# Altium footprint library connectors_socets.pcblib: 601 footprints (part 5 of 38)
Each footprint in its own frame and in the unit in brackets; x right, y up, seen from the top. Pads: shape width x height; smd on the part's side, far side on the other; paste and mask are expansions set on the pad; w line width, h text height; cw(c..) or ccw(c..) is an arc to the next point about the centre after c.
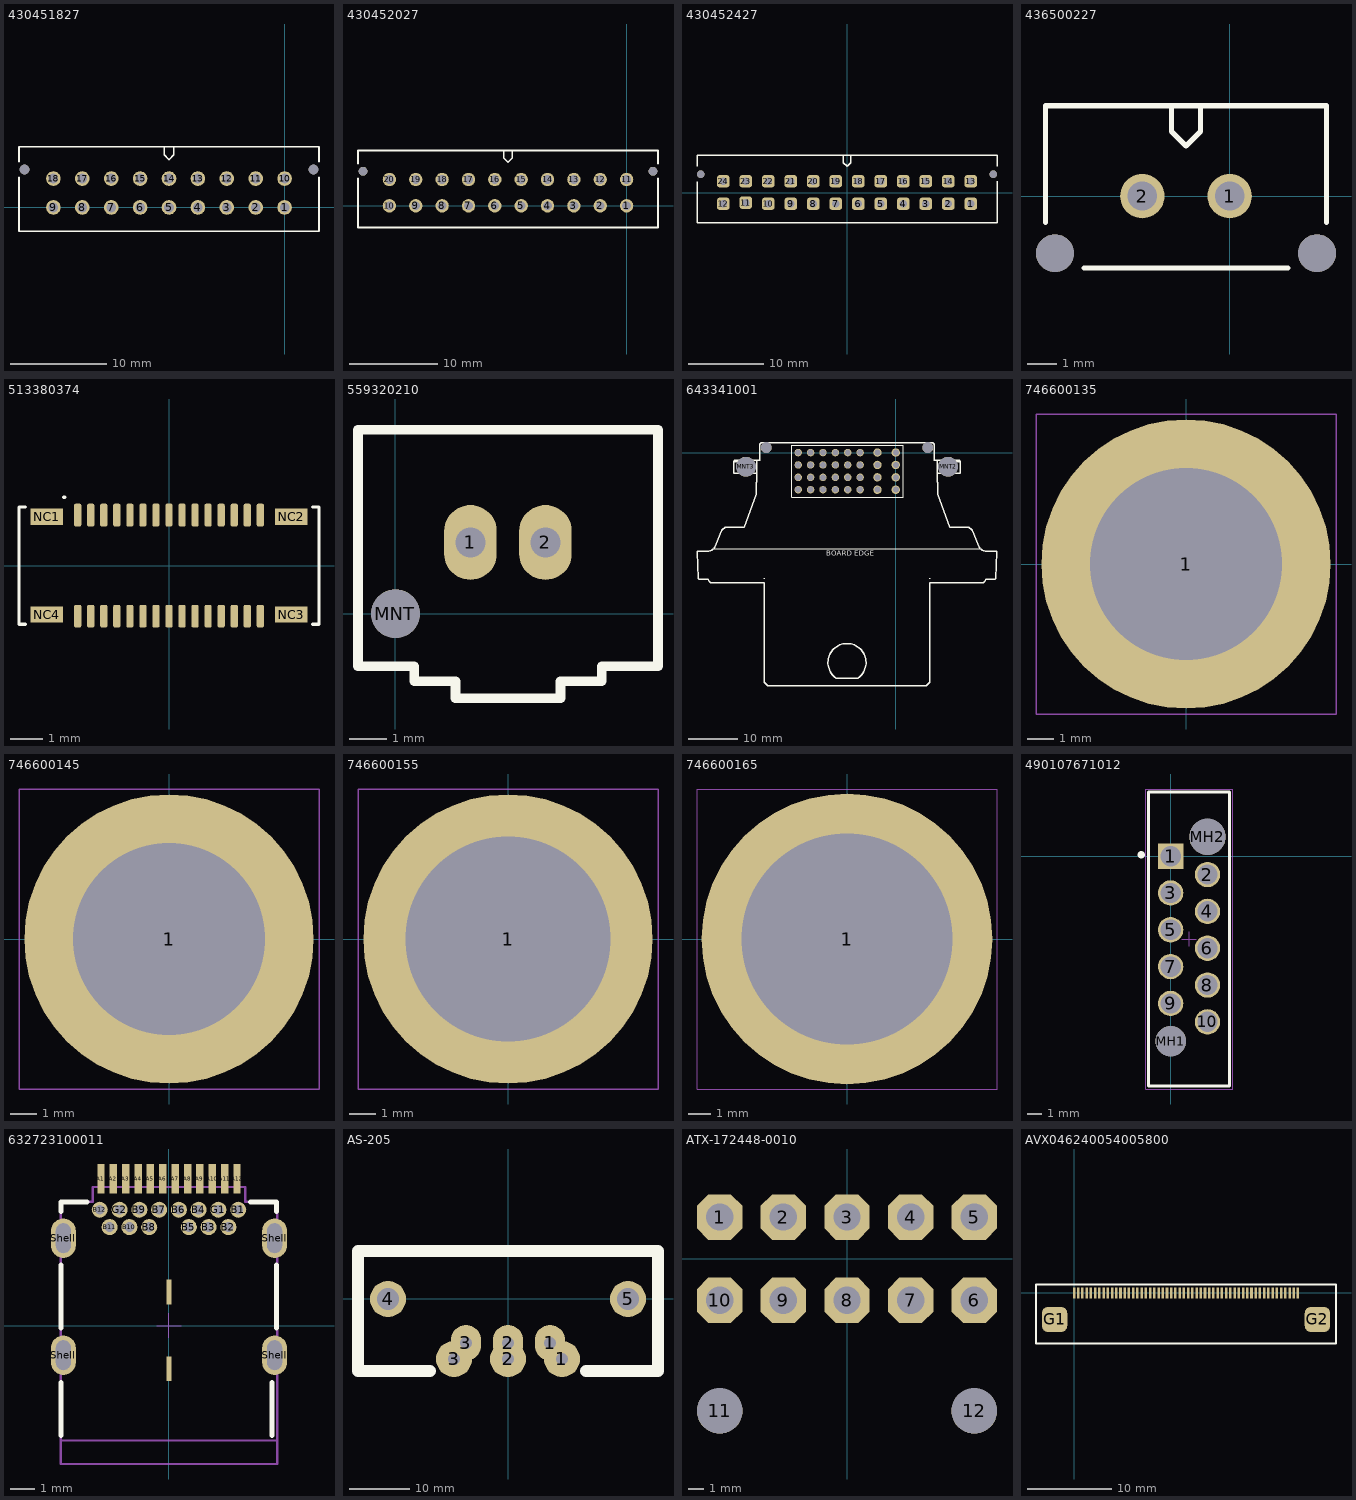
[diagram p4: the footprints below, top view; thin cyan lines are the x and y axes]

## 430451827 [mm]
height 9.91
pads (20):
  round 1.52 hole 1 mask+0.076: 1(0,0) 2(-3,0) 3(-6,0) 4(-9,0) 5(-12,0) 6(-15,0) 7(-18,0) 8(-21,0) 9(-24,0) 10(0,3) 11(-3,3) 12(-6,3) 13(-9,3) 14(-12,3) 15(-15,3) 16(-18,3) 17(-21,3) 18(-24,3)
  round 1 hole 1 unplated: MNT1(-27,3.94) MNT1(3,3.94)
Top Overlay:
  lines w0.18: -27.575,3.11 -27.575,-2.47 3.575,-2.47 3.575,3.11 ; -27.575,4.77 -27.575,6.3 3.575,6.3 3.575,4.77 ; -12.5,6.3 -12.5,5.47 -12,4.97 -11.5,5.47 -11.5,6.3
3D body "430451827--3DModel-STEP-56544.STEP": height 9.91, standoff -3.18, extent -27.575,-2.47 3.575,6.3

## 430452027 [mm]
height 9.91
pads (22):
  round 1.52 hole 1 mask+0.076: 1(0,0) 2(-3,0) 3(-6,0) 4(-9,0) 5(-12,0) 6(-15,0) 7(-18,0) 8(-21,0) 9(-24,0) 10(-27,0) 11(0,3) 12(-3,3) 13(-6,3) 14(-9,3) 15(-12,3) 16(-15,3) 17(-18,3) 18(-21,3) 19(-24,3) 20(-27,3)
  round 1 hole 1 unplated: MNT1(-30,3.94) MNT1(3,3.94)
Top Overlay:
  lines w0.18: -30.575,3.11 -30.575,-2.47 3.575,-2.47 3.575,3.11 ; -30.575,4.77 -30.575,6.3 3.575,6.3 3.575,4.77 ; -14,6.3 -14,5.47 -13.5,4.97 -13,5.47 -13,6.3
3D body "430452027--3DModel-STEP-56544.STEP": height 9.91, standoff -3.18, extent -30.575,-2.47 3.575,6.3

## 430452427 [mm]
pads (26):
  rrect50% 1.7x1.7 hole 1: 1(16.5,-1.47) 2(13.5,-1.47) 3(10.5,-1.47) 4(7.5,-1.47) 5(4.5,-1.47) 6(1.5,-1.47) 7(-1.5,-1.47) 8(-4.5,-1.47) 9(-7.5,-1.47) 10(-10.5,-1.47) 11(-13.5,-1.326) 12(-16.5,-1.47) 13(16.5,1.53) 14(13.5,1.53) 15(10.5,1.53) 16(7.5,1.53) 17(4.5,1.53) 18(1.5,1.53) 19(-1.5,1.53) 20(-4.5,1.53) 21(-7.5,1.53) 22(-10.5,1.53) 23(-13.5,1.53) 24(-16.5,1.53)
  round 1 hole 1 unplated: MNT1(19.5,2.47) MNT2(-19.5,2.47)
Top Overlay:
  lines w0.18: -20,1.5 -20,-4 20,-4 20,1.53 ; -20,3.5 -20,5 20,5 20,3.5 ; -0.5,5 -0.5,4 0,3.5 0.5,4 0.5,5
3D body "430452427.stp": height 9.95, standoff -3.14, extent -20.075,-3.94 20.075,4.83

## 436500227 [mm]
height 9.9
pads (4):
  round 1.52 hole 1 mask+0.076: 1(0,0) 2(-3,0)
  round 1.3 hole 1.3 unplated mask+0.076: ""(-6,-1.96) ""(3,-1.96)
Top Overlay:
  lines w0.18: -6.325,-0.9 -6.325,3.1 3.325,3.1 3.325,-0.9 ; -5,-2.47 2,-2.47 ; -2,3.05 -2,2.22 -1.5,1.72 -1,2.22 -1,3.05
Plata3D:
3D body "436500227--3DModel-STEP-455599.STEP": height 9.9, standoff -3.18, extent -6.325,-2.47 3.325,3.135

## 513380374 [mm] "molex board to board"
pads (34):
  rrect50% 0.22x0.7 smd mask+0.05: 1(-2.8,1.55) 2(-2.4,1.55) 3(-2,1.55) 4(-1.6,1.55) 5(-1.2,1.55) 6(-0.8,1.55) 7(-0.4,1.55) 8(0,1.55) 9(0.4,1.55) 10(0.8,1.55) 11(1.2,1.55) 12(1.6,1.55) 13(2,1.55) 14(2.4,1.55) 15(2.8,1.55) 16(2.8,-1.55) 17(2.4,-1.55) 18(2,-1.55) 19(1.6,-1.55) 20(1.2,-1.55) 21(0.8,-1.55) 22(0.4,-1.55) 23(0,-1.55) 24(-0.4,-1.55) 25(-0.8,-1.55) 26(-1.2,-1.55) 27(-1.6,-1.55) 28(-2,-1.55) 29(-2.4,-1.55) 30(-2.8,-1.55)
  rect 1x0.5 smd mask+0.05: NC1(-3.75,1.5) NC2(3.75,1.5) NC3(3.75,-1.5) NC4(-3.75,-1.5)
Top Overlay:
  lines w0.1: -4.4,-1.8 -4.6,-1.8 -4.6,1.8 -4.4,1.8 ; -3.225,2.1 -3.2,2.1 ; 4.4,-1.8 4.6,-1.8 4.6,1.8 4.4,1.8
3D body "513380374.stp": height 1.4, standoff 0, extent -4.55,-1.705 4.55,1.705

## 559320210 [mm] "2pin molex pcb"
pads (3):
  oval 1.4x2 hole 0.8: 1(2,1.9) 2(4,1.9)
  round 1.3 hole 1.3 unplated: MNT(0,0)
Top Overlay:
  lines w0.254: -1,-1.4 -1,0.3 -1,3.7 -1,4.9 0.75,4.9 5.25,4.9 7,4.9 7,3.7 7,0.3 7,-1.4 5.5,-1.4 5.5,-1.8 4.4,-1.8 4.4,-2.25 4,-2.25 2,-2.25 1.6,-2.25 1.6,-1.8 0.5,-1.8 0.5,-1.4 -1,-1.4
3D body "559320210.stp": height 9.75, standoff -3.19, extent -1,-1.8 7,4.9

## 643341001 [mm] "Molex connectors"
pads (36):
  round 1.5 hole 1.2: A1(-19.7,0) A2(-19.7,-2.5) A3(-19.7,-4.999) A4(-19.7,-7.499) B1(-17.2,0) B2(-17.2,-2.5) B3(-17.2,-4.999) B4(-17.2,-7.499) C1(-14.7,0) C2(-14.7,-2.5) C3(-14.7,-4.999) C4(-14.7,-7.499) D1(-12.2,0) D2(-12.2,-2.5) D3(-12.2,-4.999) D4(-12.2,-7.499) E1(-9.7,0) E2(-9.7,-2.5) E3(-9.7,-4.999) E4(-9.7,-7.499) F1(-7.2,0) F2(-7.2,-2.5) F3(-7.2,-4.999) F4(-7.2,-7.499)
  round 1.7 hole 1.2: G1(-3.7,0) G2(-3.7,-2.5) G3(-3.7,-4.999) G4(-3.7,-7.499) H1(0,0) H2(0,-2.5) H3(0,-4.999) H4(0,-7.499)
  round 2.2 hole 2.2 unplated: MNT1(6.45,1) MNT4(-26.15,1)
  round 4 hole 4 unplated: MNT2(10.55,-2.85) MNT3(-30.25,-2.85)
Top Overlay:
  drawing of 589 lines, arcs and shapes, not listed
  text "BOARD EDGE" at -14,-20.85 h1
3D body "643341001.stp": height 32.16, standoff -8.02, extent -40.138,-47.1 20.438,2

## 746600135 [mm] "Bush SMD open"
height 3
pads (1):
  round 11 / inner round 0 / far side round 0 hole 7.3 unplated: 1(0,0)
Top Paste:
  region: 0.5,5.377 0.811,5.348 1.421,5.219 2.013,5.02 2.578,4.755 3.109,4.427 3.598,4.039 4.039,3.598 4.427,3.109 4.755,2.578 5.02,2.013 5.219,1.421 5.348,0.811 5.377,0.5 3.716,0.5 3.663,0.801 3.485,1.384 3.214,1.931 2.859,2.427 2.427,2.859 1.931,3.214 1.385,3.485 0.801,3.663 0.5,3.716
  region: 5.377,-0.5 5.348,-0.811 5.219,-1.421 5.02,-2.013 4.755,-2.578 4.427,-3.109 4.039,-3.598 3.598,-4.039 3.109,-4.427 2.578,-4.755 2.013,-5.02 1.421,-5.219 0.811,-5.348 0.5,-5.377 0.5,-3.716 0.801,-3.663 1.384,-3.485 1.931,-3.214 2.427,-2.859 2.859,-2.427 3.214,-1.931 3.485,-1.385 3.663,-0.801 3.716,-0.5
  region: -0.5,-5.377 -0.811,-5.348 -1.421,-5.219 -2.013,-5.02 -2.578,-4.755 -3.109,-4.427 -3.598,-4.039 -4.039,-3.598 -4.427,-3.109 -4.755,-2.578 -5.02,-2.013 -5.219,-1.421 -5.348,-0.811 -5.377,-0.5 -3.716,-0.5 -3.663,-0.801 -3.485,-1.384 -3.214,-1.931 -2.859,-2.427 -2.427,-2.859 -1.931,-3.214 -1.385,-3.485 -0.801,-3.663 -0.5,-3.716
  region: -5.377,0.5 -5.348,0.811 -5.219,1.421 -5.02,2.013 -4.755,2.578 -4.427,3.109 -4.039,3.598 -3.598,4.039 -3.109,4.427 -2.578,4.755 -2.013,5.02 -1.421,5.219 -0.811,5.348 -0.5,5.377 -0.5,3.716 -0.801,3.663 -1.384,3.485 -1.931,3.214 -2.427,2.859 -2.859,2.427 -3.214,1.931 -3.485,1.385 -3.663,0.801 -3.716,0.5
Plata3D:
  circle w0.1: c0,0 r5
Board3D:
  lines w0.05: -0.5,0 0.5,0 ; 0,-0.5 0,0.5 ; -5.7,-5.7 5.7,-5.7 5.7,5.7 -5.7,5.7 -5.7,-5.7
3D body "746600135.stp": height 3, standoff -2.6, extent -5,-5 5,5

## 746600145 [mm] "Bush SMD open"
height 3
pads (1):
  round 11 / inner round 0 / far side round 0 hole 7.3 unplated: 1(0,0)
Top Paste:
  region: 0.5,5.377 0.811,5.348 1.421,5.219 2.013,5.02 2.578,4.755 3.109,4.427 3.598,4.039 4.039,3.598 4.427,3.109 4.755,2.578 5.02,2.013 5.219,1.421 5.348,0.811 5.377,0.5 3.717,0.5 3.664,0.801 3.485,1.384 3.214,1.931 2.859,2.427 2.427,2.859 1.931,3.214 1.384,3.485 0.801,3.664 0.5,3.717
  region: -5.377,0.5 -5.348,0.811 -5.219,1.421 -5.02,2.013 -4.755,2.578 -4.427,3.109 -4.039,3.598 -3.598,4.039 -3.109,4.427 -2.578,4.755 -2.013,5.02 -1.421,5.219 -0.811,5.348 -0.5,5.377 -0.5,3.717 -0.801,3.664 -1.384,3.485 -1.931,3.214 -2.427,2.859 -2.859,2.427 -3.214,1.931 -3.485,1.384 -3.664,0.801 -3.717,0.5
  region: -0.5,-5.377 -0.811,-5.348 -1.421,-5.219 -2.013,-5.02 -2.578,-4.755 -3.109,-4.427 -3.598,-4.039 -4.039,-3.598 -4.427,-3.109 -4.755,-2.578 -5.02,-2.013 -5.219,-1.421 -5.348,-0.811 -5.377,-0.5 -3.717,-0.5 -3.664,-0.801 -3.485,-1.384 -3.214,-1.931 -2.859,-2.427 -2.427,-2.859 -1.931,-3.214 -1.384,-3.485 -0.801,-3.664 -0.5,-3.717
  region: 5.377,-0.5 5.348,-0.811 5.219,-1.421 5.02,-2.013 4.755,-2.578 4.427,-3.109 4.039,-3.598 3.598,-4.039 3.109,-4.427 2.578,-4.755 2.013,-5.02 1.421,-5.219 0.811,-5.348 0.5,-5.377 0.5,-3.717 0.801,-3.664 1.384,-3.485 1.931,-3.214 2.427,-2.859 2.859,-2.427 3.214,-1.931 3.485,-1.384 3.664,-0.801 3.717,-0.5
Plata3D:
  circle w0.1: c0,0 r5
Board3D:
  lines w0.05: -0.5,0 0.5,0 ; 0,-0.5 0,0.5 ; -5.7,-5.7 5.7,-5.7 5.7,5.7 -5.7,5.7 -5.7,-5.7
3D body "746600145.stp": height 3, standoff -2.6, extent -5,-5 5,5

## 746600155 [mm] "Bush SMD open"
height 3
pads (1):
  round 11 / inner round 0 / far side round 0 hole 7.8 unplated: 1(0,0)
Top Paste:
  region: 3.969,-0.5 3.935,-0.717 3.833,-1.145 3.684,-1.559 3.49,-1.954 3.255,-2.325 2.98,-2.669 2.669,-2.98 2.325,-3.255 1.954,-3.49 1.559,-3.684 1.145,-3.833 0.717,-3.935 0.5,-3.969 0.5,-5.377 0.811,-5.348 1.421,-5.219 2.013,-5.02 2.578,-4.755 3.109,-4.427 3.598,-4.039 4.039,-3.598 4.427,-3.109 4.755,-2.578 5.02,-2.013 5.219,-1.421 5.348,-0.811 5.377,-0.5
  region: -0.5,-3.969 -0.717,-3.935 -1.145,-3.833 -1.559,-3.684 -1.954,-3.49 -2.325,-3.255 -2.669,-2.98 -2.98,-2.669 -3.255,-2.325 -3.49,-1.954 -3.684,-1.559 -3.833,-1.145 -3.935,-0.717 -3.969,-0.5 -5.377,-0.5 -5.348,-0.811 -5.219,-1.421 -5.02,-2.013 -4.755,-2.578 -4.427,-3.109 -4.039,-3.598 -3.598,-4.039 -3.109,-4.427 -2.578,-4.755 -2.013,-5.02 -1.421,-5.219 -0.811,-5.348 -0.5,-5.377
  region: -3.969,0.5 -3.935,0.717 -3.833,1.145 -3.684,1.559 -3.49,1.954 -3.255,2.325 -2.98,2.669 -2.669,2.98 -2.325,3.255 -1.954,3.49 -1.559,3.684 -1.145,3.833 -0.717,3.935 -0.5,3.969 -0.5,5.377 -0.811,5.348 -1.421,5.219 -2.013,5.02 -2.578,4.755 -3.109,4.427 -3.598,4.039 -4.039,3.598 -4.427,3.109 -4.755,2.578 -5.02,2.013 -5.219,1.421 -5.348,0.811 -5.377,0.5
  region: 0.5,3.969 0.717,3.935 1.145,3.833 1.559,3.684 1.954,3.49 2.325,3.255 2.669,2.98 2.98,2.669 3.255,2.325 3.49,1.954 3.684,1.559 3.833,1.145 3.935,0.717 3.969,0.5 5.377,0.5 5.348,0.811 5.219,1.421 5.02,2.013 4.755,2.578 4.427,3.109 4.039,3.598 3.598,4.039 3.109,4.427 2.578,4.755 2.013,5.02 1.421,5.219 0.811,5.348 0.5,5.377
Plata3D:
  circle w0.1: c0,0 r5
Board3D:
  lines w0.05: -0.5,0 0.5,0 ; 0,-0.5 0,0.5 ; -5.7,-5.7 5.7,-5.7 5.7,5.7 -5.7,5.7 -5.7,-5.7
3D body "746600155.stp": height 3, standoff -2.6, extent -5,-5 5,5

## 746600165 [mm] "Bush SMD open"
height 3
pads (1):
  round 12.8 / inner round 0 / far side round 0 hole 9.3 unplated: 1(0,0)
Top Paste:
  region: 0.5,6.28 0.5,4.724 0.767,4.688 1.292,4.571 1.8,4.396 2.286,4.164 2.742,3.879 3.163,3.544 3.544,3.163 3.879,2.742 4.164,2.286 4.396,1.8 4.571,1.292 4.688,0.767 4.724,0.5 6.28,0.5 6.251,0.87 6.105,1.598 5.876,2.303 5.565,2.977 5.177,3.61 4.717,4.192 4.192,4.717 3.61,5.177 2.977,5.565 2.303,5.876 1.598,6.105 0.87,6.251
  region: 6.28,-0.5 4.724,-0.5 4.688,-0.767 4.571,-1.292 4.396,-1.8 4.164,-2.286 3.879,-2.742 3.544,-3.163 3.163,-3.544 2.742,-3.879 2.286,-4.164 1.8,-4.396 1.292,-4.571 0.767,-4.688 0.5,-4.724 0.5,-6.28 0.87,-6.251 1.598,-6.105 2.303,-5.876 2.977,-5.565 3.61,-5.177 4.192,-4.717 4.717,-4.192 5.177,-3.61 5.565,-2.977 5.876,-2.303 6.105,-1.598 6.251,-0.87
  region: -0.5,-6.28 -0.5,-4.724 -0.767,-4.688 -1.292,-4.571 -1.8,-4.396 -2.286,-4.164 -2.742,-3.879 -3.163,-3.544 -3.544,-3.163 -3.879,-2.742 -4.164,-2.286 -4.396,-1.8 -4.571,-1.292 -4.688,-0.767 -4.724,-0.5 -6.28,-0.5 -6.251,-0.87 -6.105,-1.598 -5.876,-2.303 -5.565,-2.977 -5.177,-3.61 -4.717,-4.192 -4.192,-4.717 -3.61,-5.177 -2.977,-5.565 -2.303,-5.876 -1.598,-6.105 -0.87,-6.251
  region: -6.28,0.5 -4.724,0.5 -4.688,0.767 -4.571,1.292 -4.396,1.8 -4.164,2.286 -3.879,2.742 -3.544,3.163 -3.163,3.544 -2.742,3.879 -2.286,4.164 -1.8,4.396 -1.292,4.571 -0.767,4.688 -0.5,4.724 -0.5,6.28 -0.87,6.251 -1.598,6.105 -2.303,5.876 -2.977,5.565 -3.61,5.177 -4.192,4.717 -4.717,4.192 -5.177,3.61 -5.565,2.977 -5.876,2.303 -6.105,1.598 -6.251,0.87
Plata3D:
  circle w0.1: c0,0 r6
Board3D:
  lines w0.05: -0.5,0 0.5,0 ; 0,-0.5 0,0.5 ; -6.6,-6.6 6.6,-6.6 6.6,6.6 -6.6,6.6 -6.6,-6.6
3D body "746600165.stp": height 3, standoff -2.6, extent -6,-6 6,6

## 490107671012 [mm]
pads (12):
  rect 1.75x1.75 hole 1.4: 1(0,0)
  round 1.75 hole 1.4: 2(2.54,-1.27) 3(0,-2.54) 4(2.54,-3.81) 5(0,-5.08) 6(2.54,-6.35) 7(0,-7.62) 8(2.54,-8.89) 9(0,-10.16) 10(2.54,-11.43)
  round 2.1 hole 2.1 unplated: MH1(0,-12.76)
  round 2.5 hole 2.5 unplated: MH2(2.54,1.33)
Top Overlay:
  circle w0.25: c-2.03,0.095 r0.125
  lines w0.2: -1.53,-15.86 4.07,-15.86 4.07,4.43 -1.53,4.43 -1.53,-15.86
Plata3D:
  lines w0.1: -1.53,-15.86 -1.53,4.43 4.07,4.43 4.07,-15.86 -1.53,-15.86
Board3D:
  lines w0.05: 0.77,-5.715 1.77,-5.715 ; 1.27,-6.215 1.27,-5.215 ; -1.73,-16.06 -1.73,4.63 4.27,4.63 4.27,-16.06 -1.73,-16.06
3D body "490107671012.stp": height 10.5, standoff -4.45, extent -1.53,-15.86 4.07,4.43

## 632723100011 [mm] "USB 3.1 Type C Receptacle Horizontal THR"
height 2.96
pads (32):
  rect 0.3x1.2 smd: A1(-2.75,5.93) A2(-2.25,5.93) A3(-1.75,5.93) A4(-1.25,5.93) A5(-0.75,5.93) A6(-0.25,5.93) A7(0.25,5.93) A8(0.75,5.93) A9(1.25,5.93) A10(1.75,5.93) A11(2.25,5.93) A12(2.75,5.93)
  round 0.65 hole 0.4: B1(2.8,4.68) B2(2.4,3.98) B3(1.6,3.98) B4(1.2,4.68) B5(0.8,3.98) B6(0.4,4.68) B7(-0.4,4.68) B8(-0.8,3.98) B9(-1.2,4.68) B10(-1.6,3.98) B11(-2.4,3.98) B12(-2.8,4.68) G1(2,4.68) G2(-2,4.68)
  oval 1x1.6 hole 0.6 slot 1.2 at 90 deg: Shell(-4.27,-1.2) Shell(-4.27,3.53) Shell(4.27,-1.2) Shell(4.27,3.53)
  rect 0.2x1 smd: Shell(0,-1.75) Shell(0,1.35)
Top Overlay:
  lines w0.2: -4.37,-4.45 -4.37,-2.3 ; -4.37,-0.1 -4.37,2.45 ; -4.37,4.6 -4.37,5 -3.32,5 ; 3.29,5 4.34,5 4.34,4.6 ; 4.17,-4.45 4.17,-2.3 ; 4.34,-0.1 4.34,2.45
Plata:
  lines w0.1: -4.37,-4.65 4.37,-4.65
  text "PCB Edge" at -1.7,-5.6 h0.61
Plata3D:
  lines w0.05: -2.85,5.6 -2.85,6.19 -2.65,6.19 -2.65,5.6 ; -2.35,5.6 -2.35,6.19 -2.15,6.19 -2.15,5.6 ; -1.85,5.6 -1.85,6.19 -1.65,6.19 -1.65,5.6 ; -1.35,5.6 -1.35,6.19 -1.15,6.19 -1.15,5.6 ; -0.85,5.6 -0.85,6.19 -0.65,6.19 -0.65,5.6 ; -0.35,5.6 -0.35,6.19 -0.15,6.19 -0.15,5.6 ; 0.15,5.6 0.15,6.19 0.35,6.19 0.35,5.6 ; 0.65,5.6 0.65,6.19 0.85,6.19 0.85,5.6 ; 1.15,5.6 1.15,6.19 1.35,6.19 1.35,5.6 ; 1.65,5.6 1.65,6.19 1.85,6.19 1.85,5.6 ; 2.15,5.6 2.15,6.19 2.35,6.19 2.35,5.6 ; 2.65,5.6 2.65,6.19 2.85,6.19 2.85,5.6
  lines w0.1: 4.34,-5.6 -4.37,-5.6 -4.37,5 -3.08,5 -3.08,5.6 3.08,5.6 3.08,5 4.37,5 4.37,-5.6
Board3D:
  lines w0.05: -0.5,0 0.5,0 ; 0,-0.5 0,0.5
3D body "632723100011.stp": height 3.05, standoff -1.81, extent -4.37,-5.6 4.37,6.194

## AS-205 [mm]
pads (8):
  oval 5x6 hole 2: 1(7,-7.3) 2(0,-7.3) 3(-7,-7.3)
  round 6 hole 2: 1(9,-10) 2(0,-10) 3(-9,-10)
  round 6 hole 3.7: 4(-20,0) 5(20,0)
Top Overlay:
  lines w2: -13,-12 -25,-12 -25,8 25,8 25,-12 13,-12
3D body "User Library-AC INLET GSP1_8101_1.step": height 30.5, standoff -3.5, extent -24.8,-12.15 24.8,12.15

## ATX-172448-0010 [mm] "DS1073-01-2x5-MR3T6(MF2x5MR)172448-0010"
pads (12):
  oct 3x3 hole 1.8: 1(-8.4,2.75) 2(-4.2,2.75) 3(0,2.75) 4(4.2,2.75) 5(8.4,2.75) 6(8.4,-2.75) 7(4.2,-2.75) 8(0,-2.75) 9(-4.2,-2.75) 10(-8.4,-2.75)
  round 3 hole 3: 11(-8.4,-10.05) 12(8.4,-10.05)
3D body "1724480010.stp": height 11.4, standoff -3.6, extent -11.1,-16.667 11.5,3.267

## AVX046240054005800 [mm] "0.5mm pitch 54 way connector fot TM035KBH11 TFT display"
height 2
pads (56):
  rect 0.3x1.3 smd: 1(0,0) 2(0.5,0) 3(1,0) 4(1.5,0) 5(2,0) 6(2.5,0) 7(3,0) 8(3.5,0) 9(4,0) 10(4.5,0) 11(5,0) 12(5.5,0) 13(6,0) 14(6.5,0) 15(7,0) 16(7.5,0) 17(8,0) 18(8.5,0) 19(9,0) 20(9.5,0) 21(10,0) 22(10.5,0) 23(11,0) 24(11.5,0) 25(12,0) 26(12.5,0) 27(13,0) 28(13.5,0) 29(14,0) 30(14.5,0) 31(15,0) 32(15.5,0) 33(16,0) 34(16.5,0) 35(17,0) 36(17.5,0) 37(18,0) 38(18.5,0) 39(19,0) 40(19.5,0) 41(20,0) 42(20.5,0) 43(21,0) 44(21.5,0) 45(22,0) 46(22.5,0) 47(23,0) 48(23.5,0) 49(24,0) 50(24.5,0) 51(25,0) 52(25.5,0) 53(26,0) 54(26.5,0)
  rrect50% 3x3 smd: G1(-2.3,-3.15) G2(28.8,-3.15)
Top Overlay:
  lines w0.2: -4.5,-6 -4.5,1 31,1 31,-6 -4.5,-6